# Altium footprint library 9-Pcblib_Con.PcbLib: 266 footprints (part 4 of 17)
Each footprint in its own frame and in the unit in brackets; x right, y up, seen from the top. Pads: shape width x height; smd on the part's side, far side on the other; paste and mask are expansions set on the pad; w line width, h text height; cw(c..) or ccw(c..) is an arc to the next point about the centre after c.
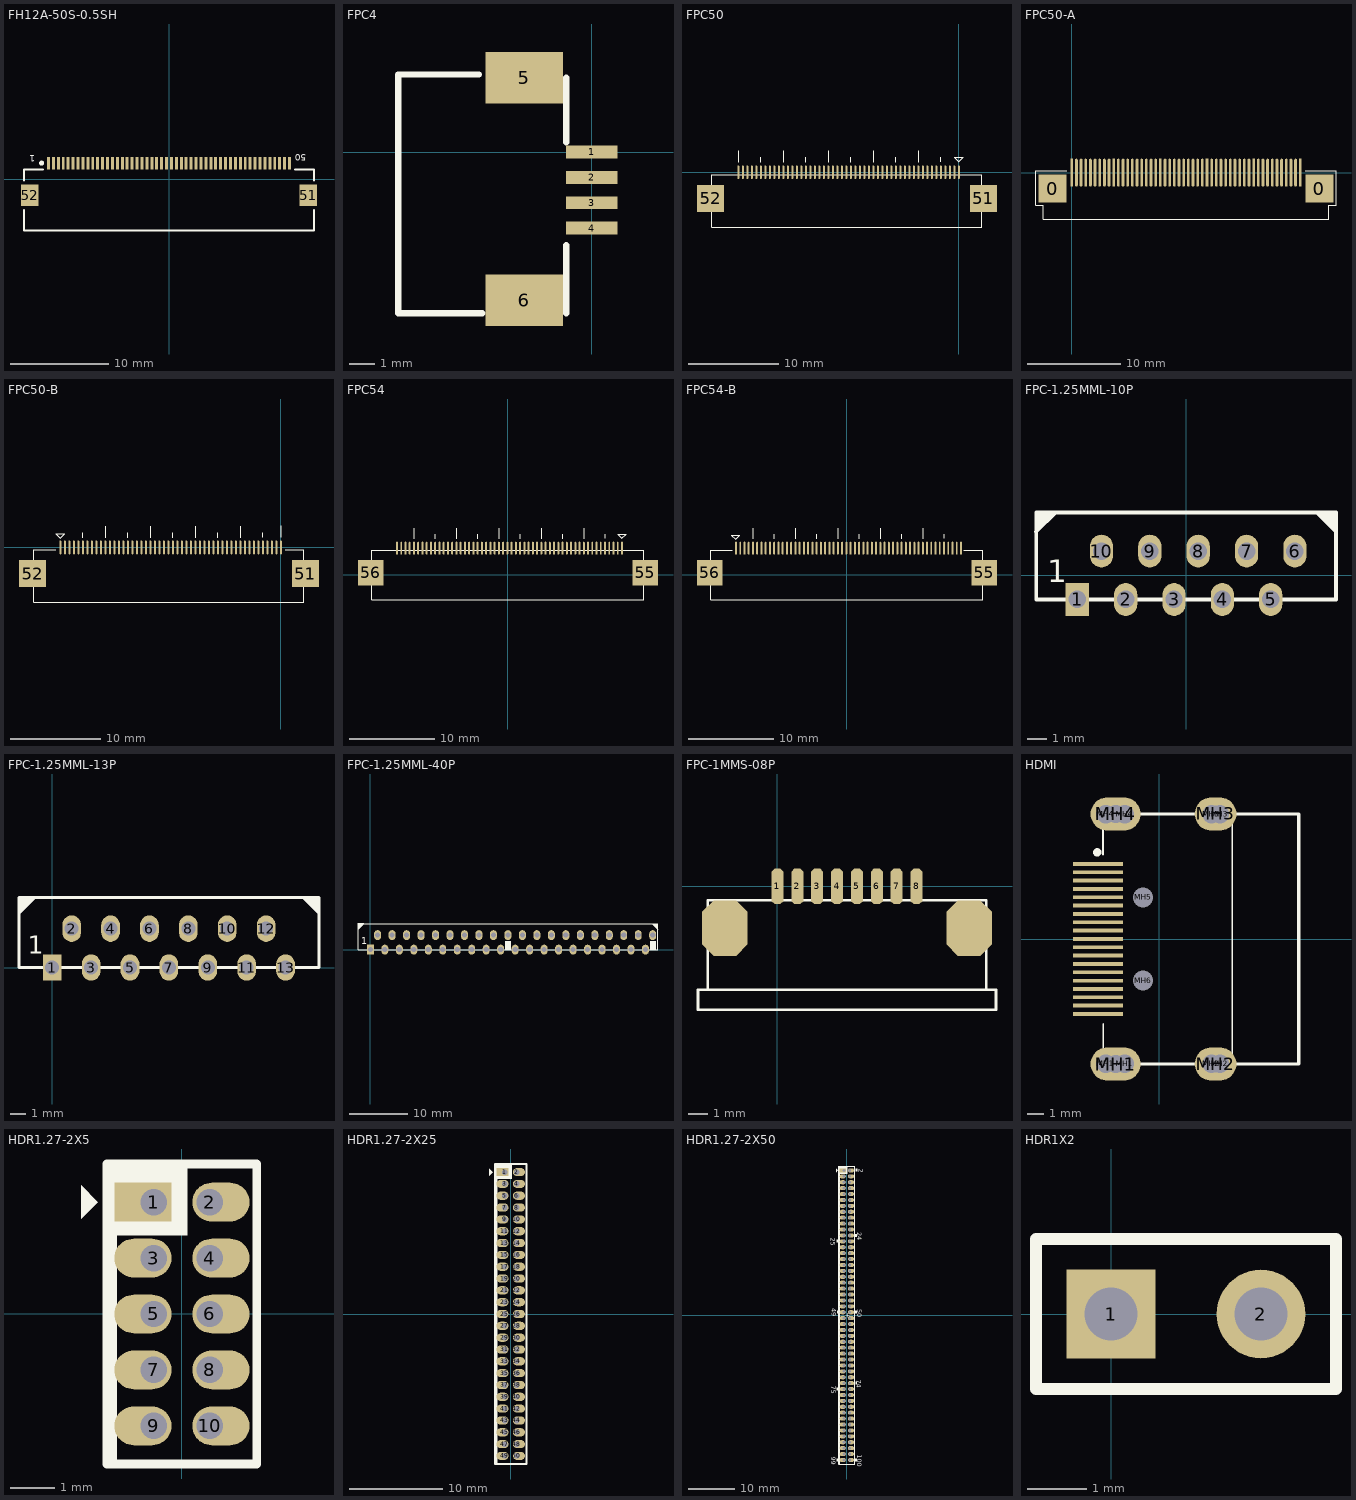
[diagram p3: the footprints below, top view; thin cyan lines are the x and y axes]

## FH12A-50S-0.5SH [mm] "Connector; FH12 Series; 50 Position; 0.5mm Spaced Top Contact"
height 2
pads (52):
  rect 0.3x1.3 smd: 1(-12.25,1.625) 2(-11.75,1.625) 3(-11.25,1.625) 4(-10.75,1.625) 5(-10.25,1.625) 6(-9.75,1.625) 7(-9.25,1.625) 8(-8.75,1.625) 9(-8.25,1.625) 10(-7.75,1.625) 11(-7.25,1.625) 12(-6.75,1.625) 13(-6.25,1.625) 14(-5.75,1.625) 15(-5.25,1.625) 16(-4.75,1.625) 17(-4.25,1.625) 18(-3.75,1.625) 19(-3.25,1.625) 20(-2.75,1.625) 21(-2.25,1.625) 22(-1.75,1.625) 23(-1.25,1.625) 24(-0.75,1.625) 25(-0.25,1.625) 26(0.25,1.625) 27(0.75,1.625) 28(1.25,1.625) 29(1.75,1.625) 30(2.25,1.625) 31(2.75,1.625) 32(3.25,1.625) 33(3.75,1.625) 34(4.25,1.625) 35(4.75,1.625) 36(5.25,1.625) 37(5.75,1.625) 38(6.25,1.625) 39(6.75,1.625) 40(7.25,1.625) 41(7.75,1.625) 42(8.25,1.625) 43(8.75,1.625) 44(9.25,1.625) 45(9.75,1.625) 46(10.25,1.625) 47(10.75,1.625) 48(11.25,1.625) 49(11.75,1.625) 50(12.25,1.625)
  rect 1.8x2.2 smd: 51(14.15,-1.625) 52(-14.15,-1.625)
Top Overlay:
  circle w0.25: c-12.95,1.625 r0.125
  lines w0.2: -14.75,-3.125 -14.75,-5.2 14.75,-5.2 14.75,-3.125 ; -14.75,-0.125 -14.75,1 -12.8,1 ; 12.8,1 14.75,1 14.75,-0.125
  text "50" at 13.958,2.54 h0.66
  text "1" at -13.601,2.413 h0.66

## FPC4 [mil]
pads (6):
  rect 80x20 smd: 1(0.21,0.2) 2(0.21,-39.17) 3(0.21,-78.54) 4(0.21,-117.91)
  rect 120x80 smd: 5(-104.79,115.2) 6(-104.79,-229.8)
Top Overlay:
  lines w10: -174.79,120.2 -299.79,120.2 -299.79,-249.8 -169.79,-249.8 ; -39.79,-249.8 -39.79,-144.8 ; -39.79,15.2 -39.79,115.2

## FPC50 [mil]
pads (52):
  oval 9x60 smd: 1(0,0) 2(-19.68,0) 3(-39.37,0) 4(-59.06,0) 5(-78.74,0) 6(-98.43,0) 7(-118.11,0) 8(-137.8,0) 9(-157.48,0) 10(-177.17,0) 11(-196.85,0) 12(-216.54,0) 13(-236.22,0) 14(-255.91,0) 15(-275.59,0) 16(-295.28,0) 17(-314.96,0) 18(-334.65,0) 19(-354.33,0) 20(-374.02,0) 21(-393.7,0) 22(-413.39,0) 23(-433.07,0) 24(-452.76,0) 25(-472.44,0) 26(-492.13,0) 27(-511.81,0) 28(-531.5,0) 29(-551.18,0) 30(-570.87,0) 31(-590.55,0) 32(-610.24,0) 33(-629.92,0) 34(-649.61,0) 35(-669.29,0) 36(-688.98,0) 37(-708.66,0) 38(-728.35,0) 39(-748.03,0) 40(-767.72,0) 41(-787.4,0) 42(-807.09,0) 43(-826.77,0) 44(-846.46,0) 45(-866.14,0) 46(-885.83,0) 47(-905.51,0) 48(-925.2,0) 49(-944.88,0) 50(-964.57,0)
  rect 118.11x118.11 smd: 51(107.87,-114.69) 52(-1086.22,-114.69)
Top Overlay:
  lines w3.94: -964.58,93.5 -964.57,43.31 ; -866.14,43.31 -866.14,64.96 ; -767.73,93.5 -767.72,43.31 ; -669.29,43.31 -669.29,64.96 ; -570.88,93.5 -570.87,43.31 ; -472.44,43.31 -472.44,64.96 ; -374.03,93.5 -374.02,43.31 ; -275.59,43.31 -275.59,64.96 ; -177.18,93.5 -177.17,43.31 ; -78.74,45.28 -78.74,64.96 ; -19.68,64.96 19.68,64.96 0,45.28 -19.68,64.96
  lines w5: -1080.71,-240 -1080.71,-10 100,-10 100,-240 -1080.71,-240
3D body: height 98.43, standoff -1.97, extent -1071,-269.73 106.17,13.73

## FPC50-A [mm]
pads (52):
  rect 3x3 smd: 0(-2.045,-1.709) 0(26.555,-1.709)
  rect 0.3x3 smd: 1(24.505,-0.009) 11(19.505,-0.009) 21(14.505,-0.009) 31(9.505,-0.009) 41(4.505,-0.009) 50(0.005,-0.009)
  oval 0.3x3 smd: 2(24.005,-0.009) 3(23.505,-0.009) 4(23.005,-0.009) 5(22.505,-0.009) 6(22.005,-0.009) 7(21.505,-0.009) 8(21.005,-0.009) 9(20.505,-0.009) 10(20.005,-0.009) 12(19.005,-0.009) 13(18.505,-0.009) 14(18.005,-0.009) 15(17.505,-0.009) 16(17.005,-0.009) 17(16.505,-0.009) 18(16.005,-0.009) 19(15.505,-0.009) 20(15.005,-0.009) 22(14.005,-0.009) 23(13.505,-0.009) 24(13.005,-0.009) 25(12.505,-0.009) 26(12.005,-0.009) 27(11.505,-0.009) 28(11.005,-0.009) 29(10.505,-0.009) 30(10.005,-0.009) 32(9.005,-0.009) 33(8.505,-0.009) 34(8.005,-0.009) 35(7.505,-0.009) 36(7.005,-0.009) 37(6.505,-0.009) 38(6.005,-0.009) 39(5.505,-0.009) 40(5.005,-0.009) 42(4.005,-0.009) 43(3.505,-0.009) 44(3.005,-0.009) 45(2.505,-0.009) 46(2.005,-0.009) 47(1.505,-0.009) 48(1.005,-0.009) 49(0.505,-0.009)
Top Overlay:
  lines w0.127: -0.52,0.191 -3.82,0.191 -3.82,-3.509 -3.02,-3.509 -3.02,-5.009 27.53,-5.009 27.53,-3.509 28.33,-3.509 28.33,0.191 25.03,0.191

## FPC50-B [mil]
pads (52):
  oval 9x60 smd: 1(-964.57,0) 2(-944.88,0) 3(-925.2,0) 4(-905.51,0) 5(-885.83,0) 6(-866.14,0) 7(-846.46,0) 8(-826.77,0) 9(-807.09,0) 10(-787.4,0) 11(-767.72,0) 12(-748.03,0) 13(-728.35,0) 14(-708.66,0) 15(-688.98,0) 16(-669.29,0) 17(-649.61,0) 18(-629.92,0) 19(-610.24,0) 20(-590.55,0) 21(-570.87,0) 22(-551.18,0) 23(-531.5,0) 24(-511.81,0) 25(-492.13,0) 26(-472.44,0) 27(-452.76,0) 28(-433.07,0) 29(-413.39,0) 30(-393.7,0) 31(-374.02,0) 32(-354.33,0) 33(-334.65,0) 34(-314.96,0) 35(-295.28,0) 36(-275.59,0) 37(-255.91,0) 38(-236.22,0) 39(-216.54,0) 40(-196.85,0) 41(-177.17,0) 42(-157.48,0) 43(-137.8,0) 44(-118.11,0) 45(-98.43,0) 46(-78.74,0) 47(-59.06,0) 48(-39.37,0) 49(-19.68,0) 50(0,0)
  rect 118.11x118.11 smd: 51(107.87,-114.69) 52(-1086.22,-114.69)
Top Overlay:
  lines w3.94: -866.14,43.31 -866.14,64.96 ; -767.73,93.5 -767.72,43.31 ; -669.29,43.31 -669.29,64.96 ; -570.88,93.5 -570.87,43.31 ; -472.44,43.31 -472.44,64.96 ; -374.03,93.5 -374.02,43.31 ; -275.59,43.31 -275.59,64.96 ; -177.18,93.5 -177.17,43.31 ; -78.74,45.28 -78.74,64.96 ; 0,45 -0.01,95.2 ; -984.68,60.96 -945.32,60.96 -965,41.28 -984.68,60.96
  lines w5: -984.25,-10 -1080.71,-10 -1080.71,-240 100,-240 100,-10 20,-10

## FPC54 [mil]
pads (56):
  oval 9x60 smd: 1(529.54,124.02) 2(509.85,124.02) 3(490.17,124.02) 4(470.48,124.02) 5(450.8,124.02) 6(431.11,124.02) 7(411.43,124.02) 8(391.74,124.02) 9(372.06,124.02) 10(352.37,124.02) 11(332.69,124.02) 12(313,124.02) 13(293.32,124.02) 14(273.63,124.02) 15(253.95,124.02) 16(234.26,124.02) 17(214.58,124.02) 18(194.89,124.02) 19(175.21,124.02) 20(155.52,124.02) 21(135.84,124.02) 22(116.15,124.02) 23(96.47,124.02) 24(76.78,124.02) 25(57.1,124.02) 26(37.41,124.02) 27(17.73,124.02) 28(-1.96,124.02) 29(-21.64,124.02) 30(-41.33,124.02) 31(-61.01,124.02) 32(-80.7,124.02) 33(-100.38,124.02) 34(-120.07,124.02) 35(-139.75,124.02) 36(-159.44,124.02) 37(-179.12,124.02) 38(-198.81,124.02) 39(-218.49,124.02) 40(-238.18,124.02) 41(-257.86,124.02) 42(-277.55,124.02) 43(-297.23,124.02) 44(-316.92,124.02) 45(-336.6,124.02) 46(-356.29,124.02) 47(-375.97,124.02) 48(-395.66,124.02) 49(-415.34,124.02) 50(-435.03,124.02) 51(-454.71,124.02) 52(-474.4,124.02) 53(-494.08,124.02) 54(-513.77,124.02)
  rect 118.11x118.11 smd: 55(637.41,9.33) 56(-635.42,9.33)
Top Overlay:
  lines w3.94: -629.91,-115.98 0,-115.98 ; -435.03,167.32 -435.04,217.52 ; -336.6,167.32 -336.6,188.98 ; -238.18,167.32 -238.19,217.52 ; -139.75,167.32 -139.75,188.98 ; -41.33,167.32 -41.34,217.52 ; 57.1,167.32 57.1,188.98 ; 155.52,167.32 155.51,217.52 ; 253.95,167.32 253.95,188.98 ; 352.37,167.32 352.36,217.52 ; 450.8,169.29 450.8,188.98 ; 509.85,188.98 549.22,188.98 529.54,169.29 509.85,188.98
  lines w5: -629.91,-115.98 -629.91,114.02 629.54,114.02 629.54,-115.98 -629.91,-115.98

## FPC54-B [mil]
pads (56):
  oval 9x60 smd: 1(-513.77,124.02) 2(-494.08,124.02) 3(-474.4,124.02) 4(-454.71,124.02) 5(-435.03,124.02) 6(-415.34,124.02) 7(-395.66,124.02) 8(-375.97,124.02) 9(-356.29,124.02) 10(-336.6,124.02) 11(-316.92,124.02) 12(-297.23,124.02) 13(-277.55,124.02) 14(-257.86,124.02) 15(-238.18,124.02) 16(-218.49,124.02) 17(-198.81,124.02) 18(-179.12,124.02) 19(-159.44,124.02) 20(-139.75,124.02) 21(-120.07,124.02) 22(-100.38,124.02) 23(-80.7,124.02) 24(-61.01,124.02) 25(-41.33,124.02) 26(-21.64,124.02) 27(-1.96,124.02) 28(17.73,124.02) 29(37.41,124.02) 30(57.1,124.02) 31(76.78,124.02) 32(96.47,124.02) 33(116.15,124.02) 34(135.84,124.02) 35(155.52,124.02) 36(175.21,124.02) 37(194.89,124.02) 38(214.58,124.02) 39(234.26,124.02) 40(253.95,124.02) 41(273.63,124.02) 42(293.32,124.02) 43(313,124.02) 44(332.69,124.02) 45(352.37,124.02) 46(372.06,124.02) 47(391.74,124.02) 48(411.43,124.02) 49(431.11,124.02) 50(450.8,124.02) 51(470.48,124.02) 52(490.17,124.02) 53(509.85,124.02) 54(529.54,124.02)
  rect 118.11x118.11 smd: 55(637.41,9.33) 56(-635.42,9.33)
Top Overlay:
  lines w3.94: -629.91,-115.98 0,-115.98 ; -435.03,167.32 -435.04,217.52 ; -336.6,167.32 -336.6,188.98 ; -238.18,167.32 -238.19,217.52 ; -139.75,167.32 -139.75,188.98 ; -41.33,167.32 -41.34,217.52 ; 57.1,167.32 57.1,188.98 ; 155.52,167.32 155.51,217.52 ; 253.95,167.32 253.95,188.98 ; 352.37,167.32 352.36,217.52 ; 450.8,169.29 450.8,188.98 ; -535.15,184.98 -515.46,165.29 -495.78,184.98 -535.15,184.98
  lines w5: -531.5,114.02 -629.91,114.02 -629.91,-115.98 629.54,-115.98 629.54,114.02 543.31,114.02

## FPC-1.25MML-10P [mm]
height 5.7
pads (10):
  rect 1.2x1.7 hole 0.9: 1(-5.625,-1.25)
  oval 1.2x1.7 hole 0.9: 2(-3.125,-1.25) 3(-0.625,-1.25) 4(1.875,-1.25) 5(4.375,-1.25) 6(5.625,1.25) 7(3.125,1.25) 8(0.625,1.25) 9(-1.875,1.25) 10(-4.375,1.25)
Top Overlay:
  region: 7.736,3.25 7.736,2.256 6.742,3.25
  region: -7.761,3.265 -6.768,3.265 -7.761,2.272
  lines w0.2: -7.756,2.25 -6.756,3.25 ; 6.75,3.261 7.75,2.261 ; -7.75,-1.25 -7.75,3.25 7.75,3.25 7.75,-1.25 -7.75,-1.25
  text "1" at -7.188,-0.737 h2

## FPC-1.25MML-13P [mm]
height 5.7
pads (13):
  rect 1.2x1.7 hole 0.9: 1(0,0)
  oval 1.2x1.7 hole 0.9: 2(1.25,2.5) 3(2.5,0) 4(3.75,2.5) 5(5,0) 6(6.25,2.5) 7(7.5,0) 8(8.75,2.5) 9(10,0) 10(11.25,2.5) 11(12.5,0) 12(13.75,2.5) 13(15,0)
Top Overlay:
  region: -2.136,4.515 -1.143,4.515 -2.136,3.522
  region: 17.15,4.485 17.15,3.491 16.156,4.485
  lines w0.2: -2.118,3.5 -1.118,4.5 ; 16.129,4.5 17.129,3.5 ; -2.125,0 17.15,0 17.15,4.5 -2.125,4.5 -2.125,0
  text "1" at -1.563,0.513 h2

## FPC-1.25MML-40P [mm]
height 5.7
pads (40):
  rect 1.2x1.7 hole 0.9: 1(0,0)
  oval 1.2x1.7 hole 0.9: 2(1.25,2.5) 3(2.5,0) 4(3.75,2.5) 5(5,0) 6(6.25,2.5) 7(7.5,0) 8(8.75,2.5) 9(10,0) 10(11.25,2.5) 11(12.5,0) 12(13.75,2.5) 13(15,0) 14(16.25,2.5) 15(17.5,0) 16(18.75,2.5) 17(20,0) 18(21.25,2.5) 19(22.5,0) 20(23.75,2.5) 21(25,0) 22(26.25,2.5) 23(27.5,0) 24(28.75,2.5) 25(30,0) 26(31.25,2.5) 27(32.5,0) 28(33.75,2.5) 29(35,0) 30(36.25,2.5) 31(37.5,0) 32(38.75,2.5) 33(40,0) 34(41.25,2.5) 35(42.5,0) 36(43.75,2.5) 37(45,0) 38(46.25,2.5) 39(47.5,0) 40(48.75,2.5)
Top Overlay:
  rectangle: 23.241,0 24.282,1.524
  rectangle: 48.26,0 49.276,1.524
  region: 49.662,4.485 49.662,3.491 48.668,4.485
  region: -2.136,4.515 -1.143,4.515 -2.136,3.522
  lines w0.2: -2.118,3.5 -1.118,4.5 ; 48.641,4.5 49.641,3.5 ; -2.125,0 -2.125,4.5 49.65,4.5 49.65,0 -2.125,0
  text "1" at -1.563,0.513 h2

## FPC-1MMS-08P [mm]
pads (10):
  oct 0.6x1.8 smd: 1(0.002,0.007) 2(1.002,0.007) 3(2.002,0.007) 4(3.002,0.007) 5(4.002,0.007) 6(5.002,0.007) 7(6.002,0.007) 8(7.002,0.007)
  oct 2.3x2.8 smd: ""(-2.648,-2.093) ""(9.652,-2.093)
Top Overlay:
  lines w0.127: -3.498,-5.193 -3.498,-0.693 10.502,-0.693 10.502,-5.193 ; -3.998,-6.193 -3.998,-5.193 11.002,-5.193 11.002,-6.193 -3.998,-6.193

## HDMI [mm]
pads (33):
  rect 3x0.23 smd: 1(-3.656,4.5) 2(-3.656,4) 3(-3.656,3.5) 4(-3.656,3) 5(-3.656,2.5) 6(-3.656,2) 7(-3.656,1.5) 8(-3.656,1) 9(-3.656,0.5) 10(-3.656,0) 11(-3.656,-0.5) 12(-3.656,-1) 13(-3.656,-1.5) 14(-3.656,-2) 15(-3.656,-2.5) 16(-3.656,-3) 17(-3.656,-3.5) 18(-3.656,-4) 19(-3.656,-4.5)
  round 1.1 hole 1.1: MH1(-3.202,-7.493) MH1(-2.059,-7.493) MH2(3.148,-7.493) MH2(3.656,-7.493) MH3(3.148,7.493) MH3(3.656,7.493) MH4(-3.202,7.493) MH4(-2.059,7.493)
  oval 3x2 hole 1.1: MH1(-2.606,-7.5) MH4(-2.606,7.5)
  oval 2.5x2 hole 1: MH2(3.394,-7.5) MH3(3.394,7.5)
  round 1.1 hole 1.2: MH5(-0.956,2.5) MH6(-0.956,-2.5)
Top Overlay:
  circle w0.25: c-3.706,5.2 r0.125
  lines w0.1: -3.356,-5.08 -3.356,-7.5 3.894,-7.5 ; -3.356,5.073 -3.356,7.493 ; -3.213,7.5 4.037,7.5 ; 4.394,-7.5 4.394,7.5 ; 8.394,-7.5 8.394,7.5
  lines w0.2: -1.256,-7.5 3.894,-7.5 ; -1.256,7.5 3.394,7.5 ; 3.783,-7.5 8.394,-7.5 8.394,7.5 4.545,7.5
Mechanical 1:
  lines w0.1: -3.106,-8.05 cw(c-3.106,-7.5) -3.106,-6.95 -2.106,-6.95 cw(c-2.106,-7.5) -2.106,-8.05 -3.106,-8.05 ; -3.106,6.95 cw(c-3.106,7.5) -3.106,8.05 -2.106,8.05 cw(c-2.106,7.5) -2.106,6.95 -3.106,6.95 ; 3.148,-8.05 cw(c3.148,-7.5) 3.148,-6.95 3.656,-6.95 cw(c3.656,-7.5) 3.656,-8.05 3.148,-8.05 ; 3.148,6.95 cw(c3.148,7.5) 3.148,8.05 3.656,8.05 cw(c3.656,7.5) 3.656,6.95 3.148,6.95
3D body: height 5.98, standoff -2.02, extent -3.505,-8.354 6.395,7.846

## HDR1.27-2X5 [mm]
pads (10):
  rect 1.3x0.88 hole 0.6 copper offset -0.25,0: 1(-0.635,2.54)
  oval 1.3x0.88 hole 0.6 copper offset 0.25,0: 2(0.635,2.54) 4(0.635,1.27) 6(0.635,0) 8(0.635,-1.27) 10(0.635,-2.54)
  oval 1.3x0.88 hole 0.6 copper offset -0.25,0: 3(-0.635,1.27) 5(-0.635,0) 7(-0.635,-1.27) 9(-0.635,-2.54)
Top Overlay:
  rectangle: -1.5,1.778 0.127,3.405
  region: -2.286,2.921 -2.286,2.159 -1.905,2.54
  lines w0.2: -1.573,-3.405 -1.573,3.405 ; -1.7,-3.405 -1.7,3.405 1.7,3.405 1.7,-3.405 -1.7,-3.405
Bottom Overlay:
  rectangle: -1.5,1.778 0.127,3.405
  region: -2.286,2.921 -2.286,2.159 -1.905,2.54
  lines w0.2: -1.573,-3.405 -1.573,3.405 ; -1.7,-3.405 -1.7,3.405 1.7,3.405 1.7,-3.405 -1.7,-3.405
3D body: height 7.37, standoff -2.25, extent -2.819,-4.788 2.897,4.737

## HDR1.27-2X25 [mm]
pads (50):
  rect 1.3x0.88 hole 0.6 copper offset -0.25,0: 1(-0.635,15.24)
  oval 1.3x0.88 hole 0.6 copper offset 0.25,0: 2(0.635,15.24) 4(0.635,13.97) 6(0.635,12.7) 8(0.635,11.43) 10(0.635,10.16) 12(0.635,8.89) 14(0.635,7.62) 16(0.635,6.35) 18(0.635,5.08) 20(0.635,3.81) 22(0.635,2.54) 24(0.635,1.27) 26(0.635,0) 28(0.635,-1.27) 30(0.635,-2.54) 32(0.635,-3.81) 34(0.635,-5.08) 36(0.635,-6.35) 38(0.635,-7.62) 40(0.635,-8.89) 42(0.635,-10.16) 44(0.635,-11.43) 46(0.635,-12.7) 48(0.635,-13.97) 50(0.635,-15.24)
  oval 1.3x0.88 hole 0.6 copper offset -0.25,0: 3(-0.635,13.97) 5(-0.635,12.7) 7(-0.635,11.43) 9(-0.635,10.16) 11(-0.635,8.89) 13(-0.635,7.62) 15(-0.635,6.35) 17(-0.635,5.08) 19(-0.635,3.81) 21(-0.635,2.54) 23(-0.635,1.27) 25(-0.635,0) 27(-0.635,-1.27) 29(-0.635,-2.54) 31(-0.635,-3.81) 33(-0.635,-5.08) 35(-0.635,-6.35) 37(-0.635,-7.62) 39(-0.635,-8.89) 41(-0.635,-10.16) 43(-0.635,-11.43) 45(-0.635,-12.7) 47(-0.635,-13.97) 49(-0.635,-15.24)
Top Overlay:
  rectangle: -1.5,14.478 0.127,16.105
  region: -2.286,15.621 -2.286,14.859 -1.905,15.24
  lines w0.2: -1.5,-16.105 -1.5,16.105 ; -1.7,-16.105 1.7,-16.105 1.7,16.105 -1.7,16.105 -1.7,-16.105

## HDR1.27-2X50 [mm]
pads (100):
  rect 1.3x0.88 hole 0.6 copper offset -0.25,0: 1(-0.635,31.115)
  oval 1.3x0.88 hole 0.6 copper offset 0.25,0: 2(0.635,31.115) 4(0.635,29.845) 6(0.635,28.575) 8(0.635,27.305) 10(0.635,26.035) 12(0.635,24.765) 14(0.635,23.495) 16(0.635,22.225) 18(0.635,20.955) 20(0.635,19.685) 22(0.635,18.415) 24(0.635,17.145) 26(0.635,15.875) 28(0.635,14.605) 30(0.635,13.335) 32(0.635,12.065) 34(0.635,10.795) 36(0.635,9.525) 38(0.635,8.255) 40(0.635,6.985) 42(0.635,5.715) 44(0.635,4.445) 46(0.635,3.175) 48(0.635,1.905) 50(0.635,0.635) 52(0.635,-0.635) 54(0.635,-1.905) 56(0.635,-3.175) 58(0.635,-4.445) 60(0.635,-5.715) 62(0.635,-6.985) 64(0.635,-8.255) 66(0.635,-9.525) 68(0.635,-10.795) 70(0.635,-12.065) 72(0.635,-13.335) 74(0.635,-14.605) 76(0.635,-15.875) 78(0.635,-17.145) 80(0.635,-18.415) 82(0.635,-19.685) 84(0.635,-20.955) 86(0.635,-22.225) 88(0.635,-23.495) 90(0.635,-24.765) 92(0.635,-26.035) 94(0.635,-27.305) 96(0.635,-28.575) 98(0.635,-29.845) 100(0.635,-31.115)
  oval 1.3x0.88 hole 0.6 copper offset -0.25,0: 3(-0.635,29.845) 5(-0.635,28.575) 7(-0.635,27.305) 9(-0.635,26.035) 11(-0.635,24.765) 13(-0.635,23.495) 15(-0.635,22.225) 17(-0.635,20.955) 19(-0.635,19.685) 21(-0.635,18.415) 23(-0.635,17.145) 25(-0.635,15.875) 27(-0.635,14.605) 29(-0.635,13.335) 31(-0.635,12.065) 33(-0.635,10.795) 35(-0.635,9.525) 37(-0.635,8.255) 39(-0.635,6.985) 41(-0.635,5.715) 43(-0.635,4.445) 45(-0.635,3.175) 47(-0.635,1.905) 49(-0.635,0.635) 51(-0.635,-0.635) 53(-0.635,-1.905) 55(-0.635,-3.175) 57(-0.635,-4.445) 59(-0.635,-5.715) 61(-0.635,-6.985) 63(-0.635,-8.255) 65(-0.635,-9.525) 67(-0.635,-10.795) 69(-0.635,-12.065) 71(-0.635,-13.335) 73(-0.635,-14.605) 75(-0.635,-15.875) 77(-0.635,-17.145) 79(-0.635,-18.415) 81(-0.635,-19.685) 83(-0.635,-20.955) 85(-0.635,-22.225) 87(-0.635,-23.495) 89(-0.635,-24.765) 91(-0.635,-26.035) 93(-0.635,-27.305) 95(-0.635,-28.575) 97(-0.635,-29.845) 99(-0.635,-31.115)
Top Overlay:
  rectangle: -1.5,30.353 0.127,31.98
  rectangle: 1.88,30.861 2.261,31.496
  rectangle: -2.261,15.596 -1.88,16.231
  rectangle: 1.753,16.815 2.184,17.45
  rectangle: 1.753,0.33 2.134,0.965
  rectangle: -2.108,0.33 -1.727,0.965
  rectangle: 1.829,-14.935 2.21,-14.3
  rectangle: -2.21,-16.205 -1.829,-15.57
  rectangle: 1.778,-31.445 2.159,-30.81
  rectangle: -2.21,-31.471 -1.829,-30.836
  region: -2.286,31.496 -2.286,30.734 -1.905,31.115
  lines w0.2: -1.524,-31.877 -1.524,31.877 ; -1.7,-31.98 1.7,-31.98 1.7,31.98 -1.7,31.98 -1.7,-31.98
  text "+" at -0.33,-0.508 h1
  text "2" at 2.515,31.496 h1
  text "100" at 2.261,-29.947 h1
  text "99" at -3.302,-30.429 h1
  text "50" at 2.235,1.295 h1
  text "49" at -3.277,1.524 h1
  text "24" at 2.261,17.831 h1
  text "25" at -3.454,16.612 h1
  text "74" at 2.108,-13.843 h1
  text "75" at -3.404,-15.138 h1
Bottom Overlay:
  rectangle: -1.5,30.353 0.127,31.98
  region: -2.286,31.496 -2.286,30.734 -1.905,31.115
  lines w0.2: -1.524,-31.877 -1.524,31.877 ; -1.7,-31.98 1.7,-31.98 1.7,31.98 -1.7,31.98 -1.7,-31.98

## HDR1X2 [mm] "Connector; Header; 2 Position"
pads (2):
  rect 1.5x1.5 hole 0.9: 1(0,0)
  round 1.5 hole 0.9: 2(2.54,0)
Top Overlay:
  lines w0.2: -1.27,-1.27 3.81,-1.27 3.81,1.27 -1.27,1.27 -1.27,-1.27
3D body: height 8.54, standoff -3, extent -1.27,-1.27 3.81,1.27